# Altium schematic symbol library IC_ADI.SCHLIB: 3169 symbols (part 41 of 181)
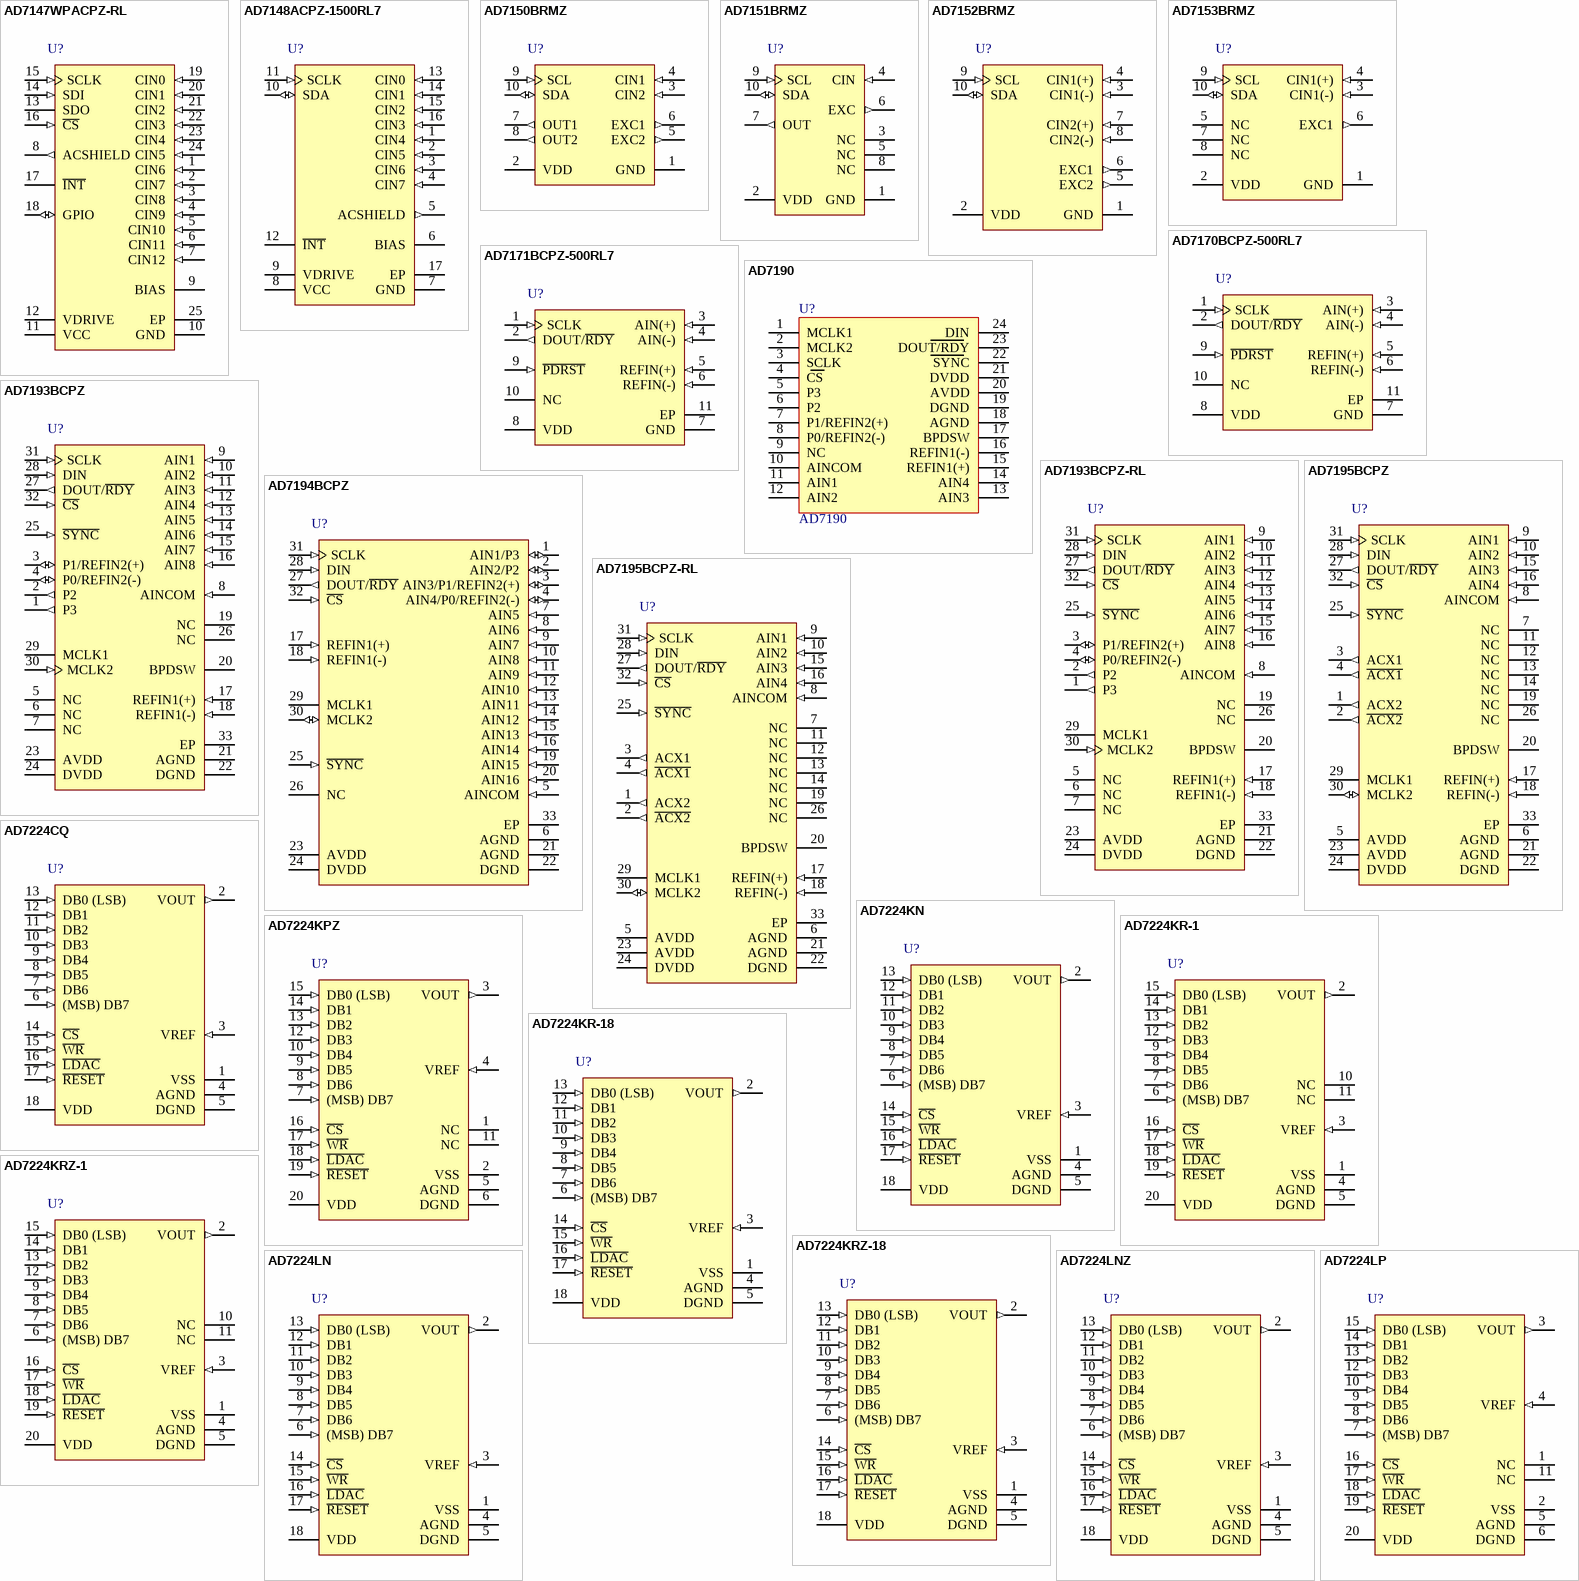
[diagram p231: symbols AD7147WPACPZ-RL to AD7224LP]

## AD7195BCPZ
designator U?
Quad 24-Bit Ultralow Noise Sigma-Delta Analog-to-Digital Converter with Serial, SPI Interface and PGA, 4.8KSPS, -40 to +105 degC, CP-32-11, Pb-Free, Tray; Generic Part Number: AD7195; PartNumber: AD7195BCPZ; Resolution (Bits): 24; Channels: 4; Throughput Rate (SPS): 4.8K; Interface: Ser, SPI; DatasheetVersion: Rev.0; PackageVersion: 011708-A; PackageReference: CP-32-11; PackageDescription: 32-Lead Lead Frame Chip Scale Package [LFCSP_VQ] 5 x 5 mm Body, Very Thin Quad; Supplier Part Number 1: AD7195BCPZ-ND; Supplier Part Number 2: 2096179; Supplier Part Number 3: 91T4810; Supplier Part Number 4: 67R2255; Supplier Part Number 5: 584-AD7195BCPZ; RoHS: Y; Packing: Tray; Mounting Technology: Surface Mount; ComponentLink1Description: Manufacturer URL; ComponentLink2Description: Datasheet; ComponentLink3Description: Package Specification; ComponentLink4Description: Product URL
footprint QFN32_0.5-PAD(5X5) (Footprint not found)
pins: 1 ACX2 (out) "Digital Output. Provides a signal that can be used to control the reversing of the bridge excitation in ac excited bridge applications. In ac mode, ACX2 toggles in anti-phase with ACX1. If the ACX bit equals zero (ac (See Datasheet)", 2 ~{ACX2} (out) "Digital Output. Provides a signal that can be used to control the reversing of the bridge excitation in ac excited bridge applications. This output is the inverse of ACX2. If the ACX bit equals zero (ac excitation turned (See Datasheet)", 3 ACX1 (out) "Digital Output. Provides a signal that can be used to control the reversing of the bridge excitation in ac excited bridge applications. When ACX1 is high, the bridge excitation is taken as normal and when ACX1 is low, the (See Datasheet)", 4 ~{ACX1} (out) "Digital Output. Provides a signal that can be used to control the reversing of the bridge excitation in ac excited bridge applications. This output is the inverse of ACX1. When A\C\X\1\ is low, the bridge excitation is taken (See Datasheet)", 5 AVDD (power) "Analog Supply Voltage, 4.75 V to 5.25 V. AVDD is independent of DVDD.", 6 AGND (power) "Analog Ground Reference Point.", 7 NC "No Connect. This pin should be tied to AGND.", 8 AINCOM (in) "Analog inputs AIN1 to AIN4 are referenced to this input when configured for pseudo differential operation.", 9 AIN1 (in) "Analog Input. This pin can be configured as the positive input of a fully differential input pair when used with AIN2 or as a pseudo differential input when used with AINCOM.", 10 AIN2 (in) "Analog Input. This pin can be configured as the negative input of a fully differential input pair when used with AIN1 or as a pseudo differential input when used with AINCOM.", 11 NC "No Connect. This pin should be tied to AGND.", 12 NC "No Connect. This pin should be tied to AGND.", 13 NC "No Connect. This pin should be tied to AGND.", 14 NC "No Connect. This pin should be tied to AGND.", 15 AIN3 (in) "Analog Input. This pin can be configured as the positive input of a fully differential input pair when used with AIN4 or as a pseudo differential input when used with AINCOM.", 16 AIN4 (in) "Analog Input. This pin can be configured as the negative input of a fully differential input pair when used with AIN3 or as a pseudo differential input when used with AINCOM.", 17 REFIN(+) (in) "Positive Reference Input. An external reference can be applied between REFIN(+) and REFIN(-). REFIN(+) can lie anywhere between AVDD and AGND + 1 V. The nominal reference voltage, (REFIN(+) - REFIN(-)), is AVDD,but the part (See Datasheet)", 18 REFIN(-) (in) "Negative Reference Input. This reference input can lie anywhere between AGND and AVDD - 1 V.", 19 NC "No Connect. This pin should be tied to AGND.", 20 BPDSW "Bridge Power-Down Switch to AGND.", 21 AGND (power) "Analog Ground Reference Point.", 22 DGND (power) "Digital Ground Reference Point.", 23 AVDD (power) "Analog Supply Voltage, 4.75 V to 5.25 V. AVDD is independent of DVDD.", 24 DVDD (power) "Digital Supply Voltage, 2.7 V to 5.25 V. DVDD is independent of AVDD.", 25 ~{SYNC} (in) "Logic input that allows for synchronization of the digital filters and analog modulators when using a number of AD7195 devices. While S\Y\N\C\ is low, the nodes of the digital filter, the filter control logic, and the (See Datasheet)", 26 NC "No Connect. This pin should be tied to AGND.", 27 DOUT/~{RDY} (out) "Serial Data Output/Data Ready Output. DOUT/R\D\Y\ serves a dual purpose. It functions as a serial data output pin to access the output shift register of the ADC. The output shift register can contain data from any of the (See Datasheet)", 28 DIN (in) "Serial Data Input to the Input Shift Register on the ADC. Data in this shift register is transferred to the control registers in the ADC, with the register selection bits of the communications register identifying the (See Datasheet)", 29 MCLK1 "When the master clock for the device is provided externally by a crystal, the crystal is connected between MCLK1 and MCLK2.", 30 MCLK2 (io) "Master Clock Signal for the Device. The AD7195 has an internal 4.92 MHz clock. This internal clock can be made available on the MCLK2 pin. The clock for the AD7195 can be provided externally also in the form of a crystal or (See Datasheet)", 31 SCLK (in) "Serial Clock Input. This serial clock input is for data transfers to and from the ADC. The SCLK has a Schmitttriggered input, making the interface suitable for opto-isolated applications. The serial clock can be continuous (See Datasheet)", 32 ~{CS} (in) "Chip Select Input. This is an active low logic input used to select the ADC. C\S\ can be used to select the ADC in systems with more than one device on the serial bus or as a frame synchronization signal in communicating (See Datasheet)", 33 EP (power) "Connect Exposed Pad to AGND."

## AD7195BCPZ-RL
designator U?
Quad 24-Bit Ultralow Noise Sigma-Delta Analog-to-Digital Converter with Serial, SPI Interface and PGA, 4.8KSPS, -40 to +105 degC, CP-32-11, Pb-Free, Reel; Generic Part Number: AD7195; PartNumber: AD7195BCPZ-RL; Resolution (Bits): 24; Channels: 4; Throughput Rate (SPS): 4.8K; Interface: Ser, SPI; DatasheetVersion: Rev.0; PackageVersion: 011708-A; PackageReference: CP-32-11; PackageDescription: 32-Lead Lead Frame Chip Scale Package [LFCSP_VQ] 5 x 5 mm Body, Very Thin Quad; Supplier Part Number 1: AD7195BCPZ-RL-ND; Supplier Part Number 2: 67R2256; Supplier Part Number 3: 584-AD7195BCPZ-R; RoHS: Y; Packing: Reel; Mounting Technology: Surface Mount; ComponentLink1Description: Manufacturer URL; ComponentLink2Description: Datasheet; ComponentLink3Description: Package Specification; ComponentLink4Description: Product URL
footprint QFN32_0.5-PAD(5X5) (Footprint not found)
pins: 1 ACX2 (out) "Digital Output. Provides a signal that can be used to control the reversing of the bridge excitation in ac excited bridge applications. In ac mode, ACX2 toggles in anti-phase with ACX1. If the ACX bit equals zero (ac (See Datasheet)", 2 ~{ACX2} (out) "Digital Output. Provides a signal that can be used to control the reversing of the bridge excitation in ac excited bridge applications. This output is the inverse of ACX2. If the ACX bit equals zero (ac excitation turned (See Datasheet)", 3 ACX1 (out) "Digital Output. Provides a signal that can be used to control the reversing of the bridge excitation in ac excited bridge applications. When ACX1 is high, the bridge excitation is taken as normal and when ACX1 is low, the (See Datasheet)", 4 ~{ACX1} (out) "Digital Output. Provides a signal that can be used to control the reversing of the bridge excitation in ac excited bridge applications. This output is the inverse of ACX1. When A\C\X\1\ is low, the bridge excitation is taken (See Datasheet)", 5 AVDD (power) "Analog Supply Voltage, 4.75 V to 5.25 V. AVDD is independent of DVDD.", 6 AGND (power) "Analog Ground Reference Point.", 7 NC "No Connect. This pin should be tied to AGND.", 8 AINCOM (in) "Analog inputs AIN1 to AIN4 are referenced to this input when configured for pseudo differential operation.", 9 AIN1 (in) "Analog Input. This pin can be configured as the positive input of a fully differential input pair when used with AIN2 or as a pseudo differential input when used with AINCOM.", 10 AIN2 (in) "Analog Input. This pin can be configured as the negative input of a fully differential input pair when used with AIN1 or as a pseudo differential input when used with AINCOM.", 11 NC "No Connect. This pin should be tied to AGND.", 12 NC "No Connect. This pin should be tied to AGND.", 13 NC "No Connect. This pin should be tied to AGND.", 14 NC "No Connect. This pin should be tied to AGND.", 15 AIN3 (in) "Analog Input. This pin can be configured as the positive input of a fully differential input pair when used with AIN4 or as a pseudo differential input when used with AINCOM.", 16 AIN4 (in) "Analog Input. This pin can be configured as the negative input of a fully differential input pair when used with AIN3 or as a pseudo differential input when used with AINCOM.", 17 REFIN(+) (in) "Positive Reference Input. An external reference can be applied between REFIN(+) and REFIN(-). REFIN(+) can lie anywhere between AVDD and AGND + 1 V. The nominal reference voltage, (REFIN(+) - REFIN(-)), is AVDD,but the part (See Datasheet)", 18 REFIN(-) (in) "Negative Reference Input. This reference input can lie anywhere between AGND and AVDD - 1 V.", 19 NC "No Connect. This pin should be tied to AGND.", 20 BPDSW "Bridge Power-Down Switch to AGND.", 21 AGND (power) "Analog Ground Reference Point.", 22 DGND (power) "Digital Ground Reference Point.", 23 AVDD (power) "Analog Supply Voltage, 4.75 V to 5.25 V. AVDD is independent of DVDD.", 24 DVDD (power) "Digital Supply Voltage, 2.7 V to 5.25 V. DVDD is independent of AVDD.", 25 ~{SYNC} (in) "Logic input that allows for synchronization of the digital filters and analog modulators when using a number of AD7195 devices. While S\Y\N\C\ is low, the nodes of the digital filter, the filter control logic, and the (See Datasheet)", 26 NC "No Connect. This pin should be tied to AGND.", 27 DOUT/~{RDY} (out) "Serial Data Output/Data Ready Output. DOUT/R\D\Y\ serves a dual purpose. It functions as a serial data output pin to access the output shift register of the ADC. The output shift register can contain data from any of the (See Datasheet)", 28 DIN (in) "Serial Data Input to the Input Shift Register on the ADC. Data in this shift register is transferred to the control registers in the ADC, with the register selection bits of the communications register identifying the (See Datasheet)", 29 MCLK1 "When the master clock for the device is provided externally by a crystal, the crystal is connected between MCLK1 and MCLK2.", 30 MCLK2 (io) "Master Clock Signal for the Device. The AD7195 has an internal 4.92 MHz clock. This internal clock can be made available on the MCLK2 pin. The clock for the AD7195 can be provided externally also in the form of a crystal or (See Datasheet)", 31 SCLK (in) "Serial Clock Input. This serial clock input is for data transfers to and from the ADC. The SCLK has a Schmitttriggered input, making the interface suitable for opto-isolated applications. The serial clock can be continuous (See Datasheet)", 32 ~{CS} (in) "Chip Select Input. This is an active low logic input used to select the ADC. C\S\ can be used to select the ADC in systems with more than one device on the serial bus or as a frame synchronization signal in communicating (See Datasheet)", 33 EP (power) "Connect Exposed Pad to AGND."

## AD7224CQ
designator U?
Single 8-Bit LC2MOS Digital-to-Analog Converter with Output Amplifier, -40 to +85 degC, Q-18, Tube; Generic Part Number: AD7224; PartNumber: AD7224CQ; # DAC Outputs: 1; Max V+: 16.5V; Op Pwr Diss: 75mW; Resolution (Bits): 8; Settling Time: 7祍; Single Supply: Yes; DatasheetVersion: Rev.B; PackageReference: Q-18; PackageDescription: DIP, Ceramic, 18-Pin, Skinny Dual In-line Package, 300mil Wide, Pitch 2.54 mm; Supplier Part Number 1: AD7224CQ-ND; Supplier Part Number 2: 66F4791; Supplier Part Number 3: 584-AD7224CQ; Packing: Tube; RoHS: N; Mounting Technology: Through Hole; ComponentLink1Description: Manufacturer URL; ComponentLink2Description: Datasheet; ComponentLink3Description: Package Specification; ComponentLink4Description: Product URL
footprint DIP18 (Footprint not found)
pins: 1 VSS (power), 2 VOUT (out), 3 VREF (in), 4 AGND (power), 5 DGND (power), 6 (MSB) DB7 (in), 7 DB6 (in), 8 DB5 (in), 9 DB4 (in), 10 DB3 (in), 11 DB2 (in), 12 DB1 (in), 13 DB0 (LSB) (in), 14 ~{CS} (in), 15 ~{WR} (in), 16 ~{LDAC} (in), 17 ~{RESET} (in), 18 VDD (power)

## AD7224KN
designator U?
Single 8-Bit LC2MOS Digital-to-Analog Converter with Output Amplifier, 0 to +70 degC, N-18, Tube; Generic Part Number: AD7224; PartNumber: AD7224KN; # DAC Outputs: 1; Max V+: 16.5V; Op Pwr Diss: 75mW; Resolution (Bits): 8; Settling Time: 7祍; Single Supply: Yes; DatasheetVersion: Rev.B; PackageVersion: 070706-A; PackageReference: N-18; PackageDescription: 18-Lead Plastic Dual In-Line Package [PDIP] Narrow Body; Supplier Part Number 1: AD7224KN-ND; Supplier Part Number 2: 584-AD7224KN; Packing: Tube; RoHS: N; Mounting Technology: Through Hole; Code_JEDEC: MS-001; ComponentLink1Description: Manufacturer URL; ComponentLink2Description: Datasheet; ComponentLink3Description: Package Specification; ComponentLink4Description: Product URL
footprint DIP18 (Footprint not found)
pins: 1 VSS (power), 2 VOUT (out), 3 VREF (in), 4 AGND (power), 5 DGND (power), 6 (MSB) DB7 (in), 7 DB6 (in), 8 DB5 (in), 9 DB4 (in), 10 DB3 (in), 11 DB2 (in), 12 DB1 (in), 13 DB0 (LSB) (in), 14 ~{CS} (in), 15 ~{WR} (in), 16 ~{LDAC} (in), 17 ~{RESET} (in), 18 VDD (power)

## AD7224KPZ
designator U?
Single 8-Bit LC2MOS Digital-to-Analog Converter with Output Amplifier, 0 to +70 degC, P-20A, Pb-Free, Tube; Generic Part Number: AD7224; PartNumber: AD7224KPZ; # DAC Outputs: 1; Max V+: 16.5V; Op Pwr Diss: 75mW; Resolution (Bits): 8; Settling Time: 7祍; Single Supply: Yes; DatasheetVersion: Rev.B; PackageVersion: Nov-2002; PackageReference: P-20A; PackageDescription: 20-Lead Plastic Leaded Chip Carrier [PLCC]; Supplier Part Number 1: AD7224KPZ-ND; Supplier Part Number 2: 584-AD7224KPZ; Packing: Tube; RoHS: Y; Mounting Technology: Surface Mount; Code_JEDEC: MO-047-AA; ComponentLink1Description: Manufacturer URL; ComponentLink2Description: Datasheet; ComponentLink3Description: Package Specification; ComponentLink4Description: Product URL
footprint PLCC-20N (Footprint not found)
pins: 1 NC, 2 VSS (power), 3 VOUT (out), 4 VREF (in), 5 AGND (power), 6 DGND (power), 7 (MSB) DB7 (in), 8 DB6 (in), 9 DB5 (in), 10 DB4 (in), 11 NC, 12 DB3 (in), 13 DB2 (in), 14 DB1 (in), 15 DB0 (LSB) (in), 16 ~{CS} (in), 17 ~{WR} (in), 18 ~{LDAC} (in), 19 ~{RESET} (in), 20 VDD (power)

## AD7224KR-1
designator U?
Single 8-Bit LC2MOS Digital-to-Analog Converter with Output Amplifier, 0 to +70 degC, RW-20, Tube; Generic Part Number: AD7224; PartNumber: AD7224KR-1; # DAC Outputs: 1; Max V+: 16.5V; Op Pwr Diss: 75mW; Resolution (Bits): 8; Settling Time: 7祍; Single Supply: Yes; DatasheetVersion: Rev.B; PackageVersion: 060706-A; PackageReference: RW-20; PackageDescription: 20-Lead Standard Small Outline Package [SOIC_W] Wide Body; Supplier Part Number 1: AD7224KR-1-ND; Supplier Part Number 2: 584-AD7224KR-1; Packing: Tube; RoHS: N; Mounting Technology: Surface Mount; Code_JEDEC: MS-013-AC; ComponentLink1Description: Manufacturer URL; ComponentLink2Description: Datasheet; ComponentLink3Description: Package Specification; ComponentLink4Description: Product URL
footprint SOIC20W_1.27 (Footprint not found)
pins: 1 VSS (power), 2 VOUT (out), 3 VREF (in), 4 AGND (power), 5 DGND (power), 6 (MSB) DB7 (in), 7 DB6 (in), 8 DB5 (in), 9 DB4 (in), 10 NC, 11 NC, 12 DB3 (in), 13 DB2 (in), 14 DB1 (in), 15 DB0 (LSB) (in), 16 ~{CS} (in), 17 ~{WR} (in), 18 ~{LDAC} (in), 19 ~{RESET} (in), 20 VDD (power)

## AD7224KR-18
designator U?
Single 8-Bit LC2MOS Digital-to-Analog Converter with Output Amplifier, 0 to +70 degC, RW-18, Tube; Generic Part Number: AD7224; PartNumber: AD7224KR-18; # DAC Outputs: 1; Max V+: 16.5V; Op Pwr Diss: 75mW; Resolution (Bits): 8; Settling Time: 7祍; Single Supply: Yes; DatasheetVersion: Rev.B; PackageVersion: 060706-A; PackageReference: RW-18; PackageDescription: 18-Lead Standard Small Outline Package [SOIC_W] Wide Body; Supplier Part Number 1: AD7224KR-18-ND; Supplier Part Number 2: 66F5834; Supplier Part Number 3: 584-AD7224KR-18; Packing: Tube; RoHS: N; Mounting Technology: Surface Mount; Code_JEDEC: MS-013-AB; ComponentLink1Description: Manufacturer URL; ComponentLink2Description: Datasheet; ComponentLink3Description: Package Specification; ComponentLink4Description: Product URL
footprint SOIC18W_1.27 (Footprint not found)
pins: 1 VSS (power), 2 VOUT (out), 3 VREF (in), 4 AGND (power), 5 DGND (power), 6 (MSB) DB7 (in), 7 DB6 (in), 8 DB5 (in), 9 DB4 (in), 10 DB3 (in), 11 DB2 (in), 12 DB1 (in), 13 DB0 (LSB) (in), 14 ~{CS} (in), 15 ~{WR} (in), 16 ~{LDAC} (in), 17 ~{RESET} (in), 18 VDD (power)

## AD7224KRZ-1
designator U?
Single 8-Bit LC2MOS Digital-to-Analog Converter with Output Amplifier, 0 to +70 degC, RW-20, Pb-Free, Tube; Generic Part Number: AD7224; PartNumber: AD7224KRZ-1; # DAC Outputs: 1; Max V+: 16.5V; Op Pwr Diss: 75mW; Resolution (Bits): 8; Settling Time: 7祍; Single Supply: Yes; DatasheetVersion: Rev.B; PackageVersion: 060706-A; PackageReference: RW-20; PackageDescription: 20-Lead Standard Small Outline Package [SOIC_W] Wide Body; Supplier Part Number 1: AD7224KRZ-1-ND; Supplier Part Number 2: 87H9974; Supplier Part Number 3: 584-AD7224KRZ-1; Packing: Tube; RoHS: Y; Mounting Technology: Surface Mount; Code_JEDEC: MS-013-AC; ComponentLink1Description: Manufacturer URL; ComponentLink2Description: Datasheet; ComponentLink3Description: Package Specification; ComponentLink4Description: Product URL
footprint SOIC20W_1.27 (Footprint not found)
pins: 1 VSS (power), 2 VOUT (out), 3 VREF (in), 4 AGND (power), 5 DGND (power), 6 (MSB) DB7 (in), 7 DB6 (in), 8 DB5 (in), 9 DB4 (in), 10 NC, 11 NC, 12 DB3 (in), 13 DB2 (in), 14 DB1 (in), 15 DB0 (LSB) (in), 16 ~{CS} (in), 17 ~{WR} (in), 18 ~{LDAC} (in), 19 ~{RESET} (in), 20 VDD (power)

## AD7224KRZ-18
designator U?
Single 8-Bit LC2MOS Digital-to-Analog Converter with Output Amplifier, 0 to +70 degC, RW-18, Pb-Free, Tube; Generic Part Number: AD7224; PartNumber: AD7224KRZ-18; # DAC Outputs: 1; Max V+: 16.5V; Op Pwr Diss: 75mW; Resolution (Bits): 8; Settling Time: 7祍; Single Supply: Yes; DatasheetVersion: Rev.B; PackageVersion: 060706-A; PackageReference: RW-18; PackageDescription: 18-Lead Standard Small Outline Package [SOIC_W] Wide Body; Supplier Part Number 1: AD7224KRZ-18-ND; Supplier Part Number 2: 584-AD7224KRZ-18; Packing: Tube; RoHS: Y; Mounting Technology: Surface Mount; Code_JEDEC: MS-013-AB; ComponentLink1Description: Manufacturer URL; ComponentLink2Description: Datasheet; ComponentLink3Description: Package Specification; ComponentLink4Description: Product URL
footprint SOIC18W_1.27 (Footprint not found)
pins: 1 VSS (power), 2 VOUT (out), 3 VREF (in), 4 AGND (power), 5 DGND (power), 6 (MSB) DB7 (in), 7 DB6 (in), 8 DB5 (in), 9 DB4 (in), 10 DB3 (in), 11 DB2 (in), 12 DB1 (in), 13 DB0 (LSB) (in), 14 ~{CS} (in), 15 ~{WR} (in), 16 ~{LDAC} (in), 17 ~{RESET} (in), 18 VDD (power)

## AD7224LN
designator U?
Single 8-Bit LC2MOS Digital-to-Analog Converter with Output Amplifier, 0 to +70 degC, N-18, Tube; Generic Part Number: AD7224; PartNumber: AD7224LN; # DAC Outputs: 1; Max V+: 16.5V; Op Pwr Diss: 75mW; Resolution (Bits): 8; Settling Time: 7祍; Single Supply: Yes; DatasheetVersion: Rev.B; PackageVersion: 070706-A; PackageReference: N-18; PackageDescription: 18-Lead Plastic Dual In-Line Package [PDIP] Narrow Body; Supplier Part Number 1: AD7224LN-ND; Supplier Part Number 2: 584-AD7224LN; Packing: Tube; RoHS: N; Mounting Technology: Through Hole; Code_JEDEC: MS-001; ComponentLink1Description: Manufacturer URL; ComponentLink2Description: Datasheet; ComponentLink3Description: Package Specification; ComponentLink4Description: Product URL
footprint DIP18 (Footprint not found)
pins: 1 VSS (power), 2 VOUT (out), 3 VREF (in), 4 AGND (power), 5 DGND (power), 6 (MSB) DB7 (in), 7 DB6 (in), 8 DB5 (in), 9 DB4 (in), 10 DB3 (in), 11 DB2 (in), 12 DB1 (in), 13 DB0 (LSB) (in), 14 ~{CS} (in), 15 ~{WR} (in), 16 ~{LDAC} (in), 17 ~{RESET} (in), 18 VDD (power)

## AD7224LNZ
designator U?
Single 8-Bit LC2MOS Digital-to-Analog Converter with Output Amplifier, 0 to +70 degC, N-18, Pb-Free, Tube; Generic Part Number: AD7224; PartNumber: AD7224LNZ; # DAC Outputs: 1; Max V+: 16.5V; Op Pwr Diss: 75mW; Resolution (Bits): 8; Settling Time: 7祍; Single Supply: Yes; DatasheetVersion: Rev.B; PackageVersion: 070706-A; PackageReference: N-18; PackageDescription: 18-Lead Plastic Dual In-Line Package [PDIP] Narrow Body; Supplier Part Number 1: AD7224LNZ-ND; Supplier Part Number 2: 59K4567; Supplier Part Number 3: 584-AD7224LNZ; Packing: Tube; RoHS: Y; Mounting Technology: Through Hole; Code_JEDEC: MS-001; ComponentLink1Description: Manufacturer URL; ComponentLink2Description: Datasheet; ComponentLink3Description: Package Specification; ComponentLink4Description: Product URL
footprint DIP18 (Footprint not found)
pins: 1 VSS (power), 2 VOUT (out), 3 VREF (in), 4 AGND (power), 5 DGND (power), 6 (MSB) DB7 (in), 7 DB6 (in), 8 DB5 (in), 9 DB4 (in), 10 DB3 (in), 11 DB2 (in), 12 DB1 (in), 13 DB0 (LSB) (in), 14 ~{CS} (in), 15 ~{WR} (in), 16 ~{LDAC} (in), 17 ~{RESET} (in), 18 VDD (power)

## AD7224LP
designator U?
Single 8-Bit LC2MOS Digital-to-Analog Converter with Output Amplifier, 0 to +70 degC, P-20A, Tube; Generic Part Number: AD7224; PartNumber: AD7224LP; # DAC Outputs: 1; Max V+: 16.5V; Op Pwr Diss: 75mW; Resolution (Bits): 8; Settling Time: 7祍; Single Supply: Yes; DatasheetVersion: Rev.B; PackageVersion: Nov-2002; PackageReference: P-20A; PackageDescription: 20-Lead Plastic Leaded Chip Carrier [PLCC]; Supplier Part Number 1: AD7224LP-ND; Supplier Part Number 2: 584-AD7224LP; Packing: Tube; RoHS: N; Mounting Technology: Surface Mount; Code_JEDEC: MO-047-AA; ComponentLink1Description: Manufacturer URL; ComponentLink2Description: Datasheet; ComponentLink3Description: Package Specification; ComponentLink4Description: Product URL
footprint PLCC-20N (Footprint not found)
pins: 1 NC, 2 VSS (power), 3 VOUT (out), 4 VREF (in), 5 AGND (power), 6 DGND (power), 7 (MSB) DB7 (in), 8 DB6 (in), 9 DB5 (in), 10 DB4 (in), 11 NC, 12 DB3 (in), 13 DB2 (in), 14 DB1 (in), 15 DB0 (LSB) (in), 16 ~{CS} (in), 17 ~{WR} (in), 18 ~{LDAC} (in), 19 ~{RESET} (in), 20 VDD (power)

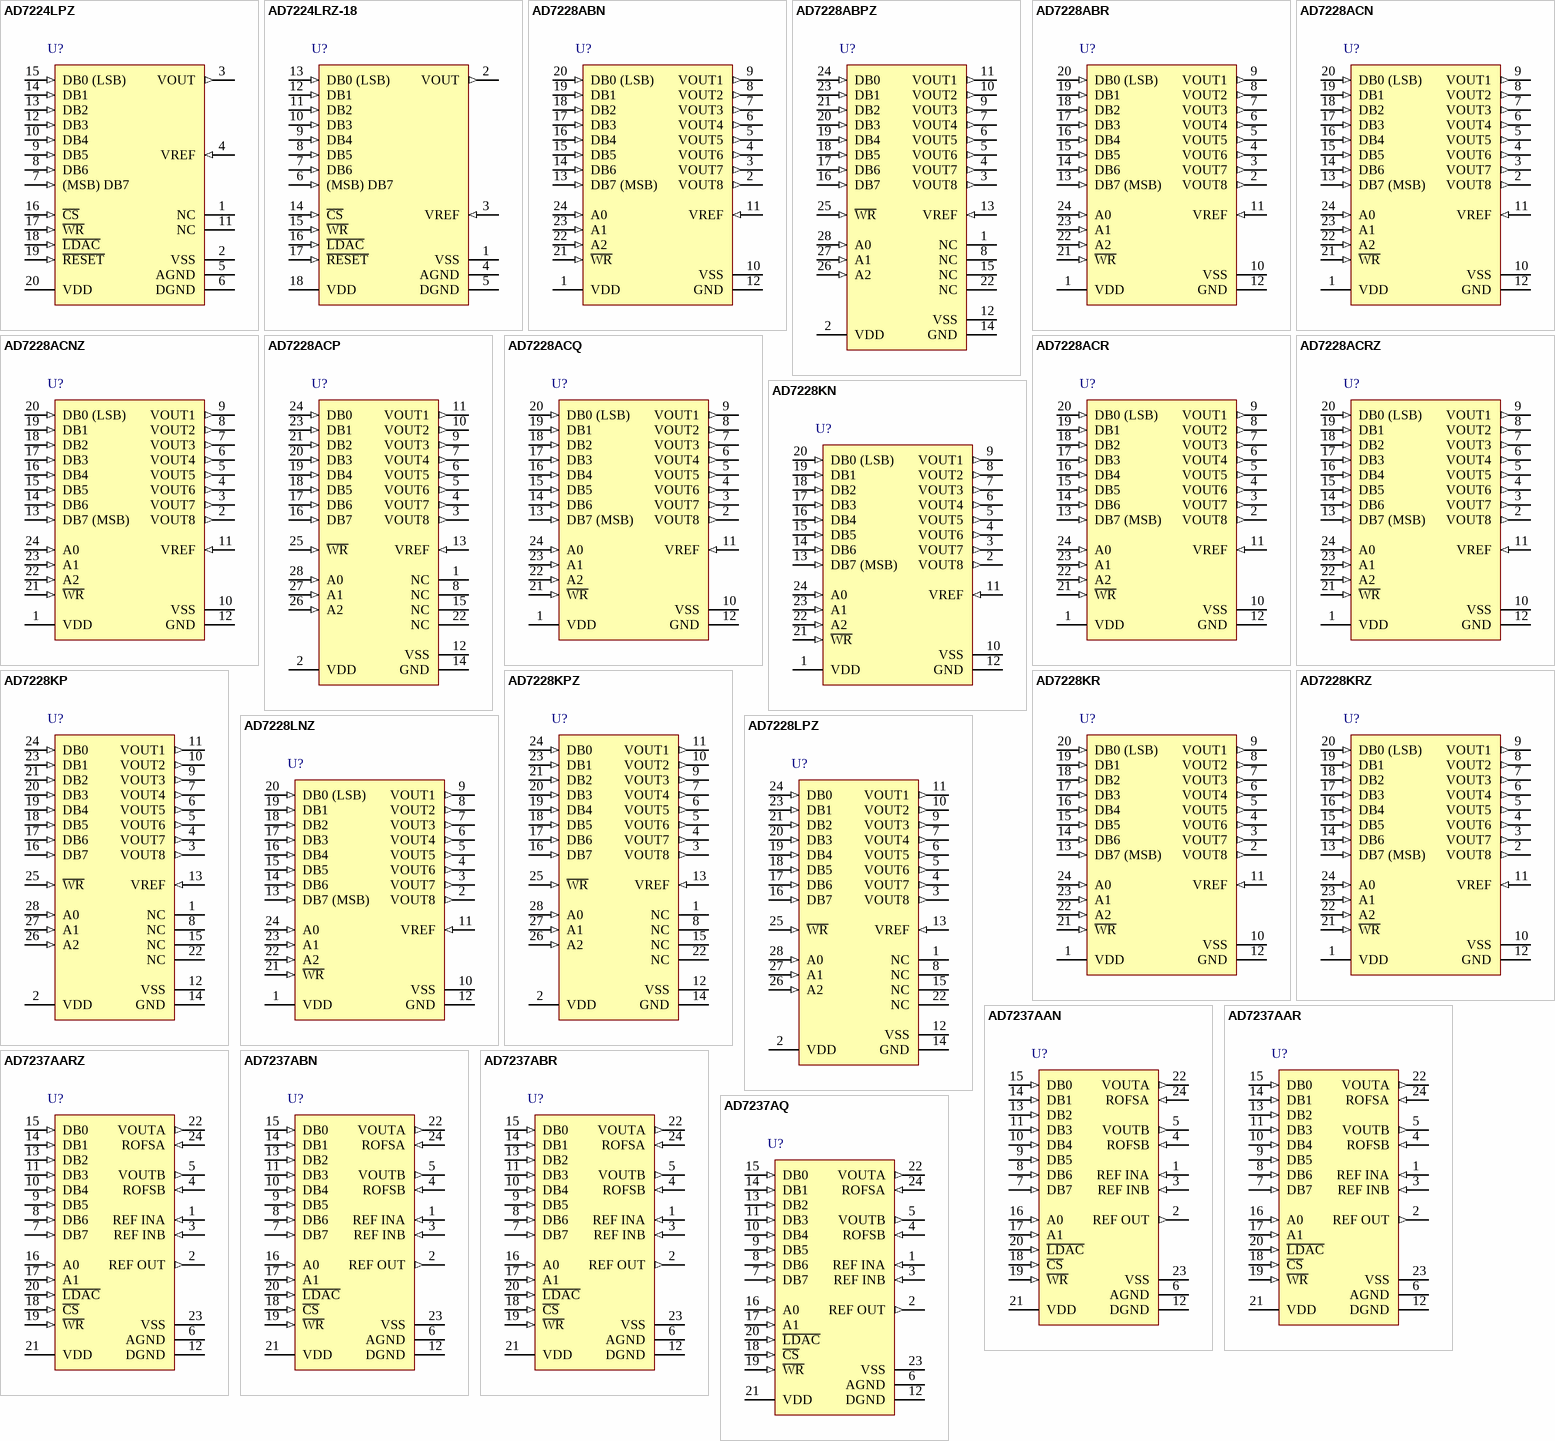
[diagram p37: symbols AD7224LPZ to AD7237AQ]

## AD7224LPZ
designator U?
Single 8-Bit LC2MOS Digital-to-Analog Converter with Output Amplifier, 0 to +70 degC, P-20A, Pb-Free, Tube; Generic Part Number: AD7224; PartNumber: AD7224LPZ; # DAC Outputs: 1; Max V+: 16.5V; Op Pwr Diss: 75mW; Resolution (Bits): 8; Settling Time: 7祍; Single Supply: Yes; DatasheetVersion: Rev.B; PackageVersion: Nov-2002; PackageReference: P-20A; PackageDescription: 20-Lead Plastic Leaded Chip Carrier [PLCC]; Supplier Part Number 1: AD7224LPZ-ND; Supplier Part Number 2: 584-AD7224LPZ; Packing: Tube; RoHS: Y; Mounting Technology: Surface Mount; Code_JEDEC: MO-047-AA; ComponentLink1Description: Manufacturer URL; ComponentLink2Description: Datasheet; ComponentLink3Description: Package Specification; ComponentLink4Description: Product URL
footprint PLCC-20N (Footprint not found)
pins: 1 NC, 2 VSS (power), 3 VOUT (out), 4 VREF (in), 5 AGND (power), 6 DGND (power), 7 (MSB) DB7 (in), 8 DB6 (in), 9 DB5 (in), 10 DB4 (in), 11 NC, 12 DB3 (in), 13 DB2 (in), 14 DB1 (in), 15 DB0 (LSB) (in), 16 ~{CS} (in), 17 ~{WR} (in), 18 ~{LDAC} (in), 19 ~{RESET} (in), 20 VDD (power)

## AD7224LRZ-18
designator U?
Single 8-Bit LC2MOS Digital-to-Analog Converter with Output Amplifier, 0 to +70 degC, RW-18, Pb-Free, Tube; Generic Part Number: AD7224; PartNumber: AD7224LRZ-18; # DAC Outputs: 1; Max V+: 16.5V; Op Pwr Diss: 75mW; Resolution (Bits): 8; Settling Time: 7祍; Single Supply: Yes; DatasheetVersion: Rev.B; PackageVersion: 060706-A; PackageReference: RW-18; PackageDescription: 18-Lead Standard Small Outline Package [SOIC_W] Wide Body; Supplier Part Number 1: AD7224LRZ-18-ND; Supplier Part Number 2: 584-AD7224LRZ-18; Packing: Tube; RoHS: Y; Mounting Technology: Surface Mount; Code_JEDEC: MS-013-AB; ComponentLink1Description: Manufacturer URL; ComponentLink2Description: Datasheet; ComponentLink3Description: Package Specification; ComponentLink4Description: Product URL
footprint SOIC18W_1.27 (Footprint not found)
pins: 1 VSS (power), 2 VOUT (out), 3 VREF (in), 4 AGND (power), 5 DGND (power), 6 (MSB) DB7 (in), 7 DB6 (in), 8 DB5 (in), 9 DB4 (in), 10 DB3 (in), 11 DB2 (in), 12 DB1 (in), 13 DB0 (LSB) (in), 14 ~{CS} (in), 15 ~{WR} (in), 16 ~{LDAC} (in), 17 ~{RESET} (in), 18 VDD (power)

## AD7228ABN
designator U?
Octal 8-Bit LC2MOS Digital-to-Analog Converter, -40 to +85 degC, N-24-1, Tube; Generic Part Number: AD7228; PartNumber: AD7228ABN; # DAC Outputs: 8; Max V+: 16.5V; Op Pwr Diss: 310mW; Settling Time: 5祍; Single Supply: Yes; DatasheetVersion: Rev.A; PackageVersion: 071006-A; PackageReference: N-24-1; PackageDescription: 24-Lead Plastic Dual In-Line Package [PDIP] Narrow Body; Supplier Part Number 1: AD7228ABN-ND; Supplier Part Number 2: 584-AD7228ABN; Packing: Tube; Resolution (Bits): 8; RoHS: N; Mounting Technology: Through Hole; Code_JEDEC: MS-001; ComponentLink1Description: Manufacturer URL; ComponentLink2Description: Datasheet; ComponentLink3Description: Package Specification; ComponentLink4Description: Product URL
footprint DIP24 (Footprint not found)
pins: 1 VDD (power), 2 VOUT8 (out), 3 VOUT7 (out), 4 VOUT6 (out), 5 VOUT5 (out), 6 VOUT4 (out), 7 VOUT3 (out), 8 VOUT2 (out), 9 VOUT1 (out), 10 VSS (power), 11 VREF (in), 12 GND (power), 13 DB7 (MSB) (in), 14 DB6 (in), 15 DB5 (in), 16 DB4 (in), 17 DB3 (in), 18 DB2 (in), 19 DB1 (in), 20 DB0 (LSB) (in), 21 ~{WR} (in), 22 A2 (in), 23 A1 (in), 24 A0 (in)

## AD7228ABPZ
designator U?
Octal 8-Bit LC2MOS Digital-to-Analog Converter, -40 to +85 degC, P-28, Pb-Free, Tube; Generic Part Number: AD7228; PartNumber: AD7228ABPZ; # DAC Outputs: 8; Max V+: 16.5V; Op Pwr Diss: 310mW; Settling Time: 5祍; Single Supply: Yes; DatasheetVersion: Rev.A; PackageVersion: 042508-A; PackageReference: P-28; PackageDescription: 28-Lead Plastic Leaded Chip Carrier [PLCC]; Supplier Part Number 1: AD7228ABPZ-ND; Supplier Part Number 2: 12M8731; Supplier Part Number 3: 584-AD7228ABPZ; Packing: Tube; Resolution (Bits): 8; RoHS: Y; Mounting Technology: Surface Mount; Code_JEDEC: MO-047-AB; ComponentLink1Description: Manufacturer URL; ComponentLink2Description: Datasheet; ComponentLink3Description: Package Specification; ComponentLink4Description: Product URL
footprint PLCC-28N (Footprint not found)
pins: 1 NC, 2 VDD (power), 3 VOUT8 (out), 4 VOUT7 (out), 5 VOUT6 (out), 6 VOUT5 (out), 7 VOUT4 (out), 8 NC, 9 VOUT3 (out), 10 VOUT2 (out), 11 VOUT1 (out), 12 VSS (power), 13 VREF (in), 14 GND (power), 15 NC, 16 DB7 (in), 17 DB6 (in), 18 DB5 (in), 19 DB4 (in), 20 DB3 (in), 21 DB2 (in), 22 NC, 23 DB1 (in), 24 DB0 (in), 25 ~{WR} (in), 26 A2 (in), 27 A1 (in), 28 A0 (in)

## AD7228ABR
designator U?
Octal 8-Bit LC2MOS Digital-to-Analog Converter, -40 to +85 degC, RW-24, Tube; Generic Part Number: AD7228; PartNumber: AD7228ABR; # DAC Outputs: 8; Max V+: 16.5V; Op Pwr Diss: 310mW; Settling Time: 5祍; Single Supply: Yes; DatasheetVersion: Rev.A; PackageVersion: 060706-A; PackageReference: RW-24; PackageDescription: 24-Lead Standard Small Outline Package [SOIC_W]; Supplier Part Number 1: AD7228ABR-ND; Supplier Part Number 2: 584-AD7228ABR; Packing: Tube; Resolution (Bits): 8; RoHS: N; Mounting Technology: Surface Mount; Code_JEDEC: MS-013-AD; ComponentLink1Description: Manufacturer URL; ComponentLink2Description: Datasheet; ComponentLink3Description: Package Specification; ComponentLink4Description: Product URL
footprint SOIC24W_1.27 (Footprint not found)
pins: 1 VDD (power), 2 VOUT8 (out), 3 VOUT7 (out), 4 VOUT6 (out), 5 VOUT5 (out), 6 VOUT4 (out), 7 VOUT3 (out), 8 VOUT2 (out), 9 VOUT1 (out), 10 VSS (power), 11 VREF (in), 12 GND (power), 13 DB7 (MSB) (in), 14 DB6 (in), 15 DB5 (in), 16 DB4 (in), 17 DB3 (in), 18 DB2 (in), 19 DB1 (in), 20 DB0 (LSB) (in), 21 ~{WR} (in), 22 A2 (in), 23 A1 (in), 24 A0 (in)

## AD7228ACN
designator U?
Octal 8-Bit LC2MOS Digital-to-Analog Converter, -40 to +85 degC, N-24-1, Tube; Generic Part Number: AD7228; PartNumber: AD7228ACN; # DAC Outputs: 8; Max V+: 16.5V; Op Pwr Diss: 310mW; Settling Time: 5祍; Single Supply: Yes; DatasheetVersion: Rev.A; PackageVersion: 071006-A; PackageReference: N-24-1; PackageDescription: 24-Lead Plastic Dual In-Line Package [PDIP] Narrow Body; Supplier Part Number 1: AD7228ACN-ND; Supplier Part Number 2: 584-AD7228ACN; Packing: Tube; Resolution (Bits): 8; RoHS: N; Mounting Technology: Through Hole; Code_JEDEC: MS-001; ComponentLink1Description: Manufacturer URL; ComponentLink2Description: Datasheet; ComponentLink3Description: Package Specification; ComponentLink4Description: Product URL
footprint DIP24 (Footprint not found)
pins: 1 VDD (power), 2 VOUT8 (out), 3 VOUT7 (out), 4 VOUT6 (out), 5 VOUT5 (out), 6 VOUT4 (out), 7 VOUT3 (out), 8 VOUT2 (out), 9 VOUT1 (out), 10 VSS (power), 11 VREF (in), 12 GND (power), 13 DB7 (MSB) (in), 14 DB6 (in), 15 DB5 (in), 16 DB4 (in), 17 DB3 (in), 18 DB2 (in), 19 DB1 (in), 20 DB0 (LSB) (in), 21 ~{WR} (in), 22 A2 (in), 23 A1 (in), 24 A0 (in)

## AD7228ACNZ
designator U?
Octal 8-Bit LC2MOS Digital-to-Analog Converter, -40 to +85 degC, N-24-1, Pb-Free, Tube; Generic Part Number: AD7228; PartNumber: AD7228ACNZ; # DAC Outputs: 8; Max V+: 16.5V; Op Pwr Diss: 310mW; Settling Time: 5祍; Single Supply: Yes; DatasheetVersion: Rev.A; PackageVersion: 071006-A; PackageReference: N-24-1; PackageDescription: 24-Lead Plastic Dual In-Line Package [PDIP] Narrow Body; Supplier Part Number 1: AD7228ACNZ-ND; Supplier Part Number 2: 59K4586; Supplier Part Number 3: 584-AD7228ACNZ; Packing: Tube; Resolution (Bits): 8; RoHS: Y; Mounting Technology: Through Hole; Code_JEDEC: MS-001; ComponentLink1Description: Manufacturer URL; ComponentLink2Description: Datasheet; ComponentLink3Description: Package Specification; ComponentLink4Description: Product URL
footprint DIP24 (Footprint not found)
pins: 1 VDD (power), 2 VOUT8 (out), 3 VOUT7 (out), 4 VOUT6 (out), 5 VOUT5 (out), 6 VOUT4 (out), 7 VOUT3 (out), 8 VOUT2 (out), 9 VOUT1 (out), 10 VSS (power), 11 VREF (in), 12 GND (power), 13 DB7 (MSB) (in), 14 DB6 (in), 15 DB5 (in), 16 DB4 (in), 17 DB3 (in), 18 DB2 (in), 19 DB1 (in), 20 DB0 (LSB) (in), 21 ~{WR} (in), 22 A2 (in), 23 A1 (in), 24 A0 (in)

## AD7228ACP
designator U?
Octal 8-Bit LC2MOS Digital-to-Analog Converter, -40 to +85 degC, P-28, Tube; Generic Part Number: AD7228; PartNumber: AD7228ACP; # DAC Outputs: 8; Max V+: 16.5V; Op Pwr Diss: 310mW; Settling Time: 5祍; Single Supply: Yes; DatasheetVersion: Rev.A; PackageVersion: 042508-A; PackageReference: P-28; PackageDescription: 28-Lead Plastic Leaded Chip Carrier [PLCC]; Supplier Part Number 1: AD7228ACP-ND; Supplier Part Number 2: 05F7294; Supplier Part Number 3: 584-AD7228ACP; Packing: Tube; Resolution (Bits): 8; RoHS: N; Mounting Technology: Surface Mount; Code_JEDEC: MO-047-AB; ComponentLink1Description: Manufacturer URL; ComponentLink2Description: Datasheet; ComponentLink3Description: Package Specification; ComponentLink4Description: Product URL
footprint PLCC-28N (Footprint not found)
pins: 1 NC, 2 VDD (power), 3 VOUT8 (out), 4 VOUT7 (out), 5 VOUT6 (out), 6 VOUT5 (out), 7 VOUT4 (out), 8 NC, 9 VOUT3 (out), 10 VOUT2 (out), 11 VOUT1 (out), 12 VSS (power), 13 VREF (in), 14 GND (power), 15 NC, 16 DB7 (in), 17 DB6 (in), 18 DB5 (in), 19 DB4 (in), 20 DB3 (in), 21 DB2 (in), 22 NC, 23 DB1 (in), 24 DB0 (in), 25 ~{WR} (in), 26 A2 (in), 27 A1 (in), 28 A0 (in)